# Altium footprint library CADTcommon.PcbLib: 503 footprints (part 3 of 32)
Each footprint in its own frame and in the unit in brackets; x right, y up, seen from the top. Pads: shape width x height; smd on the part's side, far side on the other; paste and mask are expansions set on the pad; w line width, h text height; cw(c..) or ccw(c..) is an arc to the next point about the centre after c.
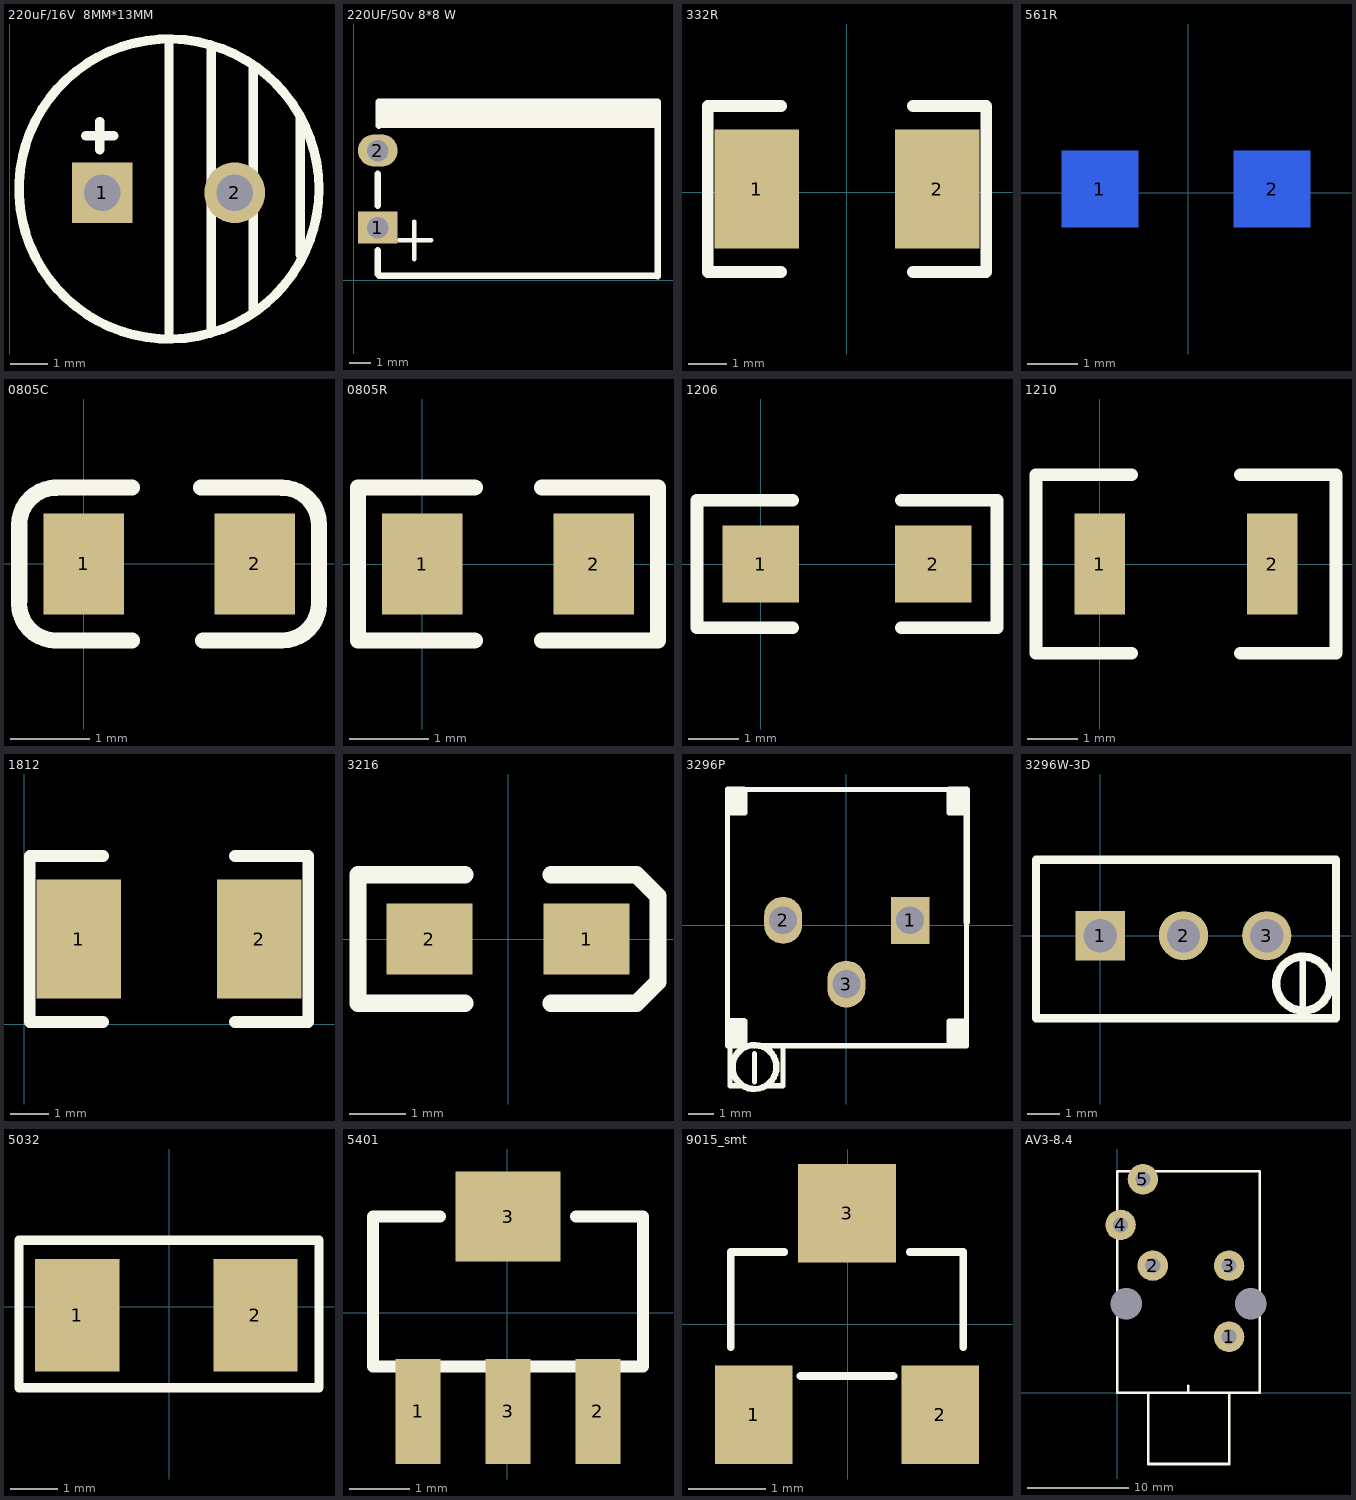
[diagram p2: the footprints below, top view; thin cyan lines are the x and y axes]

## 220uF/16V  8MM*13MM [mm]
pads (2):
  rect 1.65x1.65 hole 1: 1(2.51,4.47)
  round 1.65 hole 1: 2(6.1,4.47)
Top Overlay:
  circle w0.254: c4.318,4.572 r4.064
  lines w0.254: 2.057,6.02 2.819,6.02 ; 2.438,5.639 2.438,6.401 ; 4.318,0.508 4.318,8.636 ; 5.461,0.762 5.461,8.382 ; 6.604,1.27 6.604,7.874 ; 7.874,2.794 7.874,6.477

## 220UF/50v 8*8 W [mm]
pads (2):
  rect 1.85x1.5 hole 1: 1(1.12,2.462)
  oval 1.85x1.5 hole 1: 2(1.12,6.052)
Top Overlay:
  lines w0.2: 2.108,1.88 3.607,1.88 ; 2.819,0.991 2.819,2.743
  lines w0.3: 1.11,1.4 1.11,0.29 1.19,0.21 14.16,0.21 ; 1.12,3.49 1.12,4.98 ; 1.16,7.2 1.16,8.33 14.16,8.33 ; 1.16,7.75 14.14,7.75 ; 1.16,7.91 14.14,7.91 14.16,7.93 ; 1.16,8.12 13.97,8.12 14.16,8.31 14.16,0.19 ; 1.177,7.251 14.157,7.251 ; 1.185,7.518 14.165,7.518

## 332R [mm] "1812"
pads (2):
  rect 2.2x3.1 smd: 1(-2.337,0.086) 2(2.362,0.086)
Top Overlay:
  lines w0.305: -1.702,-2.073 -3.607,-2.073 -3.607,2.245 -1.702,2.245 ; 1.727,-2.073 3.632,-2.073 3.632,2.245 1.727,2.245

## 561R [mil] "1206"
pads (2):
  rect 60x60 smd far side: 1(-69.11,3.02) 2(65.89,3.02)
Bottom Overlay:
  lines w10: -44.11,-46.98 -119.11,-46.98 -119.11,53.02 -44.11,53.02 ; 40.89,-46.98 115.89,-46.98 115.89,53.02 40.89,53.02

## 0805C [mil]
pads (2):
  rect 40x50 smd: 1(0,0) 2(85,0)
Top Overlay:
  lines w8: -32.11,-19.59 ccw(c-13.7,-19.59) -13.7,-38 ; -32,-18.5 -32,18.5 ; -32,19.5 cw(c-13.59,19.5) -13.59,37.91 ; -14.7,-38 24,-38 ; -14.7,38 24,38 ; 58.3,38 97,38 ; 59.3,-38 98,-38 ; 98.59,-38 ccw(c98.59,-19.59) 117,-19.59 ; 98.59,37.91 cw(c98.59,19.5) 117,19.5 ; 117,-18.59 117,18.5
3D body: height 30.39, standoff -0.39, extent 3.15,-24.61 81.89,24.61

## 0805R [mil]
height 39.37
pads (2):
  rect 40x50 smd: 1(0,0) 2(85,0)
Top Overlay:
  lines w8: 26,-38 -32,-38 -32,38 26,38 ; 59.3,-38 117,-38 117,38 59.3,38 ; 117,-18.59 117,18.5
3D body: height 30.39, standoff -0.39, extent 3.26,-24.61 82,24.61

## 1206 [mil]
height 47.24
pads (2):
  rect 60x60 smd: 1(0,0) 2(135,0)
Top Overlay:
  lines w10: 25,-50 -50,-50 -50,50 25,50 ; 110,-50 185,-50 185,50 110,50
3D body: height 62.99, standoff 0, extent 5.01,-31.49 131,31.5

## 1210 [mm]
height 1.2
pads (2):
  rect 1x2 smd: 1(0,0) 2(3.429,0)
Top Overlay:
  lines w0.254: 0.635,-1.778 -1.27,-1.778 -1.27,1.778 0.635,1.778 ; 2.794,-1.778 4.699,-1.778 4.699,1.778 2.794,1.778
3D body: height 1.5, standoff 0, extent 0.027,-1.375 3.427,1.325

## 1812 [mm]
height 1.2
pads (2):
  rect 2.2x3.1 smd: 1(1.417,2.223) 2(6.116,2.223)
Top Overlay:
  lines w0.305: 2.052,0.064 0.147,0.064 0.147,4.382 2.052,4.382 ; 5.481,0.064 7.386,0.064 7.386,4.382 5.481,4.382

## 3216 [mil]
pads (2):
  rect 60x50 smd: 1(55,0) 2(-55,0)
Top Overlay:
  lines w12: -30,-45 -105,-45 -105,45 -30,45 ; 30,-45 90,-45 105,-30 105,30 90,45 30,45
3D body: height 62.99, standoff 0, extent -62.98,-31.5 63,31.5

## 3296P [mm]
pads (3):
  rect 1.5x1.85 hole 1.1: 1(2.515,0.203)
  oval 1.5x1.85 hole 1.1: 2(-2.489,0.203) 3(0,-2.311)
Top Overlay:
  circle w0.254: c-3.619,-5.575 r0.865
  lines w0.2: -4.635,-4.737 4.686,-4.737 ; -4.585,-4.737 -4.585,-6.312 -4.051,-6.312 ; -4.077,5.347 4.153,5.347 ; -4.026,-3.746 -4.686,-3.746 -4.686,-4.686 -4,-4.686 -4,-3.772 ; -4.026,5.372 -4.686,5.372 ; -4,-4.712 -4,-3.772 ; -4,5.347 -4,4.432 -4.686,4.432 -4.686,5.372 ; -3.619,-6.159 -3.619,-5.042 ; -3.061,-6.312 -2.502,-6.312 -2.502,-4.737 ; -2.476,-4.737 -4.686,-4.737 ; 4.051,-4.737 4.051,-3.797 4.737,-3.797 ; 4.712,-3.772 4.051,-3.772 4.051,-4.712 4.737,-4.712 4.737,-3.797 ; 4.737,5.372 4.737,-4.737 4.737,-3.797 ; -4.686,-4.737 -4.686,5.372 ; -4.686,-4.737 -4.686,-3.772 -4,-3.772 ; 4.051,4.432 4.737,4.432 ; 4.051,4.432 4.051,5.372 ; 4.051,4.432 4.737,4.432 ; 4.051,4.432 4.051,5.372 ; 4.051,5.372 4.712,5.372 4.051,5.372 ; 4.737,4.432 4.737,5.347 4.737,4.432
  lines w0.25: -4.483,-4.661 -4.483,-3.772 ; -4.483,4.458 -4.483,5.347 ; -4.255,-4.661 -4.255,-3.772 ; -4.255,4.458 -4.255,5.347 ; -4.077,-4.661 -4.077,-3.772 ; -4.077,4.458 -4.077,5.347 ; 4.255,-4.686 4.255,-3.797 ; 4.255,4.458 4.255,5.347 ; 4.483,-4.686 4.483,-3.797 ; 4.483,4.458 4.483,5.347 ; 4.661,-4.686 4.661,-3.797 ; 4.661,4.458 4.661,5.347
  lines w0.254: 4.737,0.127 4.737,5.347
3D body: height 5.2, standoff 0.4, extent -4.575,-6.572 4.625,10.928

## 3296W-3D [mm]
pads (3):
  rect 1.5x1.5 hole 1.016: 1(0,0)
  round 1.5 hole 1.016: 2(2.54,0) 3(5.08,0)
Top Overlay:
  circle w0.254: c6.188,-1.46 r0.823
  lines w0.2: 6.172,-2.146 6.172,-0.723
  lines w0.254: -1.956,-2.515 -1.956,2.311 7.188,2.311 7.188,-2.515 -1.956,-2.515
3D body: height 11.46, standoff -6.04, extent -2.046,-2.514 7.154,2.286

## 5032 [mm]
pads (2):
  rect 1.8x2.4 smd: 1(-1.962,-0.176) 2(1.838,-0.176)
Top Overlay:
  lines w0.2: -3.207,-1.725 -3.207,1.424 3.194,1.424 3.194,-1.725 -3.207,-1.725

## 5401 [mm] "Q"
pads (4):
  rect 0.75x1.75 smd: 1(-1.488,-1.645) 2(1.512,-1.645) 3(0.012,-1.645)
  rect 1.75x1.5 smd: 3(0.012,1.605)
Top Overlay:
  lines w0.2: -1.122,1.605 -2.238,1.605 -2.238,-0.895 2.262,-0.895 2.262,1.605 1.146,1.605

## 9015_smt [mm]
pads (3):
  rect 1x1.27 smd: 1(-1.208,-1.169) 2(1.192,-1.169)
  rect 1.27x1.27 smd: 3(-0.008,1.431)
Top Overlay:
  lines w0.1: -1.508,-0.299 -1.508,0.931 -0.818,0.931 ; -0.608,-0.669 0.592,-0.669 ; 0.802,0.931 1.492,0.931 1.492,-0.299

## AV3-8.4 [mm]
pads (7):
  round 3 hole 1.5: 1(11,5.5) 2(3.5,12.5) 3(11,12.5) 4(0.325,16.5) 5(2.525,21)
  round 3 hole 3.1 unplated: ""(0.9,8.75) ""(13.15,8.75)
Top Overlay:
  lines w0.254: 3.04,0 3.04,-7.02 11.02,-7.02 11.02,0 ; 7,0 7,0.66 ; 0,0 0,21.8 14,21.8 14,0 0,0
3D body: height 40.92, standoff -4.32, extent 0.3,-8.208 17.115,23.008